# Altium footprint library MPPT.PcbLib: 16 footprints
Each footprint in its own frame and in the unit in brackets; x right, y up, seen from the top. Pads: shape width x height; smd on the part's side, far side on the other; paste and mask are expansions set on the pad; w line width, h text height; cw(c..) or ccw(c..) is an arc to the next point about the centre after c.
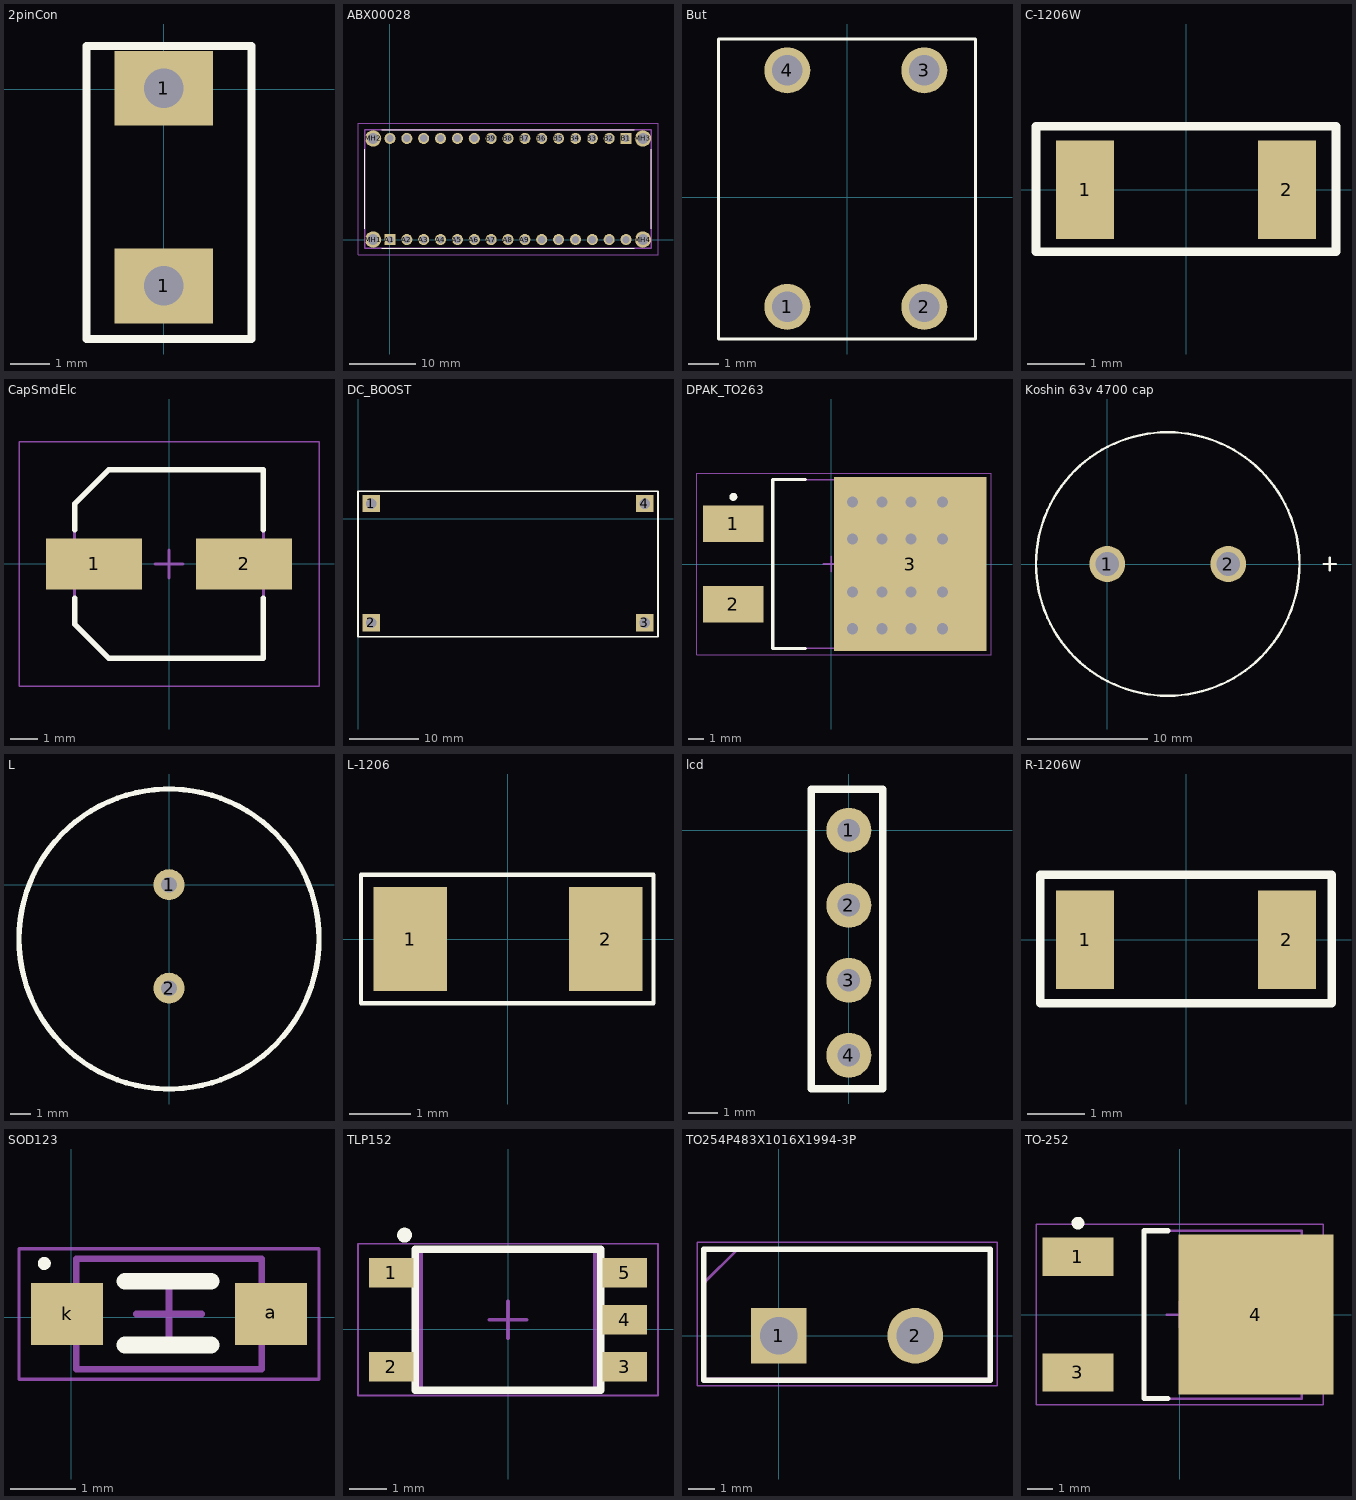
[diagram p0: the footprints below, top view; thin cyan lines are the x and y axes]

## 2pinCon [mm]
pads (2):
  rect 2.5x1.9 hole 1: 1(0,-5) 1(0,0.025)
Top Overlay:
  lines w0.2: -1.965,-6.35 2.225,-6.35 2.225,1.1 -1.965,1.1 -1.965,-6.35
3D body "User Library-bornera-1.step": height 10.01, standoff -3.74, extent -5.07,-8.001 2.53,2.499
3D body: height 1.4, standoff -1.4, extent -5,-0.775 -5,-0.775

## ABX00028 [mm]
pads (34):
  rect 1.665x1.665 hole 1.11: A1(0,0) B1(35.56,15.24)
  round 1.665 hole 1.11: A2(2.54,0) A3(5.08,0) A4(7.62,0) A5(10.16,0) A6(12.7,0) A7(15.24,0) A8(17.78,0) A9(20.32,0) A10(22.86,0) A11(25.4,0) A12(27.94,0) A13(30.48,0) A14(33.02,0) A15(35.56,0) B2(33.02,15.24) B3(30.48,15.24) B4(27.94,15.24) B5(25.4,15.24) B6(22.86,15.24) B7(20.32,15.24) B8(17.78,15.24) B9(15.24,15.24) B10(12.7,15.24) B11(10.16,15.24) B12(7.62,15.24) B13(5.08,15.24) B14(2.54,15.24) B15(0,15.24)
  round 2.475 hole 1.65: MH1(-2.54,0) MH2(-2.54,15.24) MH3(38.1,15.24) MH4(38.1,0)
Top Overlay:
  lines w0.1: -3.81,1.62 -3.81,13.62 ; -1.22,-1.27 36.78,-1.27 ; -1.22,16.51 36.78,16.51 ; 39.37,1.62 39.37,13.62
Mechanical 13:
  lines w0.2: -3.81,-1.27 -3.81,16.51 39.37,16.51 39.37,-1.27 -3.81,-1.27
Mechanical 15:
  lines w0.1: -4.81,-2.27 -4.81,17.51 40.37,17.51 40.37,-2.27 -4.81,-2.27
3D body "User Library-Nano-1.STEP": height 12.73, standoff -5.83, extent -5.588,-1.397 39.332,16.393

## But [mm]
pads (4):
  round 1.5 hole 1: 1(-1.95,-3.575) 2(2.525,-3.575) 3(2.525,4.15) 4(-1.95,4.15)
Top Overlay:
  lines w0.1: -4.2,-4.625 -1.675,-4.625 1.675,-4.625 4.2,-4.625 4.2,5.175 -4.2,5.175 -4.2,-4.625
3D body "Tactal Switch - SMD (6mmx 6mmx 9mm) - Marked.stp": height 9, standoff 0, extent -2.775,-4.334 3.257,4.684

## C-1206W [mm] "capacitor 1206 wave soldering"
pads (2):
  rect 1x1.7 smd: 1(-1.75,0) 2(1.75,0)
Top Overlay:
  lines w0.152: -2.6,-1.075 -2.6,1.1 2.6,1.1 2.6,-1.075 2.45,-1.075 -2.6,-1.075
3D body "CAP1206.stp": height 1, standoff 0, extent -1.6,-0.8 1.6,0.8

## CapSmdElc [mm] "Aluminum Electrolytic Capacitor, Body 6.70x6.70x6.30mm, IPC Low Density"
height 6.3
pads (2):
  rect 3.45x1.85 smd: 1(-2.7,0) 2(2.7,0)
Top Overlay:
  lines w0.2: -3.4,-1.225 -3.4,-2.163 -2.163,-3.4 3.4,-3.4 3.4,-1.225 ; -3.4,1.225 -3.4,2.163 -2.163,3.4 3.4,3.4 3.4,1.225
Top Assembly:
  lines w0.1: -3.4,-2.163 -3.4,2.163 -2.163,3.4 3.4,3.4 3.4,-3.4 -2.163,-3.4 -3.4,-2.163
Top Courtyard:
  lines w0.05: -5.4,-4.4 5.4,-4.4 5.4,4.4 -5.4,4.4 -5.4,-4.4
  lines w0.1: -0.5,0 0.5,0 ; 0,-0.5 0,0.5
3D body "User Library-Nichicon_CW6_3x7.STEP": height 6.92, standoff 0.01, extent -3.45,-3.275 3.55,3.325

## DC_BOOST [mm]
pads (4):
  rect 2.5x2.5 hole 1.5: 1(1.905,2.159) 2(1.905,-14.986) 3(41.275,-14.986) 4(41.275,2.159)
Top Overlay:
  lines w0.254: -0.002,-17.017 -0.002,3.937 43.178,3.937 43.178,-17.017 ; 0,-17.018 43.18,-17.018
3D body "XL6009.stp": height 12.76, standoff -5.2, extent -0.127,-17.018 43.053,4.064

## DPAK_TO263 [mm] "D2-PAK, 3-Pads, Body 7.93x8.70mm (max), IPC Medium Density"
height 4.8
pads (3):
  rect 3.81x2.32 smd: 1(-6.2,2.54) 2(-6.2,-2.54)
  rect 9.65x11 smd: 3(5,0)
via 1.35,3.925 diameter 1.27 hole 0.711
via 3.225,3.925 diameter 1.27 hole 0.711
via 5.05,3.925 diameter 1.27 hole 0.711
via 7.05,3.925 diameter 1.27 hole 0.711
via 1.35,1.575 diameter 1.27 hole 0.711
via 3.225,1.575 diameter 1.27 hole 0.711
via 5.05,1.575 diameter 1.27 hole 0.711
via 7.05,1.575 diameter 1.27 hole 0.711
via 1.35,-1.775 diameter 1.27 hole 0.711
via 3.225,-1.775 diameter 1.27 hole 0.711
via 5.05,-1.775 diameter 1.27 hole 0.711
via 7.05,-1.775 diameter 1.27 hole 0.711
via 1.35,-4.1 diameter 1.27 hole 0.711
via 3.225,-4.1 diameter 1.27 hole 0.711
via 5.05,-4.1 diameter 1.27 hole 0.711
via 7.05,-4.1 diameter 1.27 hole 0.711
Top Overlay:
  circle w0.25: c-6.2,4.25 r0.125
  lines w0.2: -1.625,-5.35 -3.7,-5.35 -3.7,5.35 -1.625,5.35
Top Assembly:
  lines w0.1: -3.7,-5.325 5.95,-5.325 5.95,5.325 -3.7,5.325 -3.7,-5.325
Top Courtyard:
  lines w0.05: -8.5,-5.75 10.125,-5.75 10.125,5.75 -8.5,5.75 -8.5,-5.75
  lines w0.1: -0.5,0 0.5,0 ; 0,-0.5 0,0.5
3D body "User Library-TO263-3S.STEP": height 4.81, standoff 0.01, extent -7.515,-4.975 8.155,5.025

## Koshin 63v 4700 cap [mm]
pads (2):
  round 3 hole 2: 1(0,0) 2(10.1,0)
Top Overlay:
  circle w0.2: c5.05,0 r11
  lines w0.2: 18.082,0 19.098,0 ; 18.59,-0.508 18.59,0.508
3D body "U1-YY.step": height 49.77, standoff -5.58, extent -6.045,-11.176 15.951,10.82

## L [mil]
pads (2):
  round 60 hole 30: 1(0,0) 2(0,-200)
Top Overlay:
  circle w10: c0,-105 r289.91
3D body "User Library-Inductor 10x12 (LS5).STEP": height 472.94, standoff -156.98, extent -198.7,-296.85 195,96.85

## L-1206 [mm]
pads (2):
  rect 1.2x1.7 smd: 1(-1.6,0) 2(1.6,0)
Top Overlay:
  lines w0.07: -2.4,-1.05 -2.4,1.05 2.375,1.05 2.375,0.692 2.375,0.556 2.375,-0.531 2.375,-1.05 -2.4,-1.05
3D body "SML-LXLC1206.stp": height 1.11, standoff 0, extent -1.73,-0.8 1.476,0.8

## lcd [mil]
pads (4):
  round 60 hole 30: 1(0,0) 2(0,-100) 3(0,-200) 4(0,-300)
Top Overlay:
  lines w10: -50,-345 -50,55 45,55 45,-345 -50,-345
3D body "User Library-AC162B.step": height 433.57, standoff -113.67, extent -109.8,-828.66 3039.8,588.66

## R-1206W [mm] "resistor 1206 wave soldering"
pads (2):
  rect 1x1.7 smd: 1(-1.75,0) 2(1.75,0)
Top Overlay:
  lines w0.152: -2.525,-1.1 -2.525,1.125 1.605,1.125 2.525,1.125 2.525,-1.1 -2.525,-1.1
3D body "RES1206.stp": height 0.55, standoff 0, extent -1.55,-0.775 1.55,0.777

## SOD123 [mm]
height 1.35
pads (2):
  rect 1.1x0.95 smd: a(3.063,0.05) k(-0.062,0.05)
Top Overlay:
  circle w0.1: c-0.412,0.825 r0.05
  lines w0.254: 0.825,-0.425 2.15,-0.425 ; 0.825,0.55 2.15,0.55
Top Assembly:
  lines w0.1: 0.075,-0.8 0.075,0.9 2.925,0.9 2.925,-0.8 0.075,-0.8
Top Courtyard:
  lines w0.05: -0.8,-0.95 -0.8,1.05 3.8,1.05 3.8,-0.95 -0.8,-0.95
  lines w0.1: 1,0.05 2,0.05 ; 1.5,-0.45 1.5,0.55
3D body "CircuitWorks-SOD123.STEP": height 1.28, standoff 0.01, extent -0.375,-0.775 3.325,0.825

## TLP152 [mm] "SOTFL, 5-Leads, Body 3.75x7.20mm, Pitch 1.27mm, IPC Medium Density"
height 2.2
pads (5):
  rect 1.2x0.8 smd: 1(-3.15,1.524) 2(-3.15,-1.016) 3(3.15,-1.016) 4(3.15,0.254) 5(3.15,1.524)
Top Overlay:
  lines w0.2: -2.5,-1.646 -2.5,2.154 2.5,2.154 2.5,-1.646 -2.5,-1.646
  lines w0.25: -2.72,2.538 cw(c-2.794,2.54) -2.72,2.547
Top Assembly:
  lines w0.1: -2.35,-1.646 2.35,-1.646 2.35,2.154 -2.35,2.154 -2.35,-1.646
Top Courtyard:
  lines w0.05: -4.05,-1.796 4.05,-1.796 4.05,2.304 -4.05,2.304 -4.05,-1.796
  lines w0.1: -0.5,0.254 0.5,0.254 ; 0,-0.246 0,0.754
3D body "User Library-TLP-152-1.STEP": height 2.11, standoff 0.01, extent -3.393,-1.651 3.383,2.149

## TO254P483X1016X1994-3P [mm]
pads (2):
  rect 2.07x2.07 hole 1.38: 1(0,0)
  round 2.07 hole 1.38: 2(5.08,0)
Top Overlay:
  lines w0.2: -2.795,-1.65 -2.795,3.225 7.874,3.225 7.874,-1.65 -2.795,-1.65
Mechanical 13:
  lines w0.1: -2.795,1.955 -1.525,3.225 ; -2.795,-1.605 -2.795,3.225 7.875,3.225 7.875,-1.605 -2.795,-1.605
Mechanical 15:
  lines w0.05: -3.045,-1.855 -3.045,3.475 8.125,3.475 8.125,-1.855 -3.045,-1.855
3D body "User Library-IRF1607 Transistors MOSFET N-Channel TO-220AB.step": height 19.19, standoff -13.73, extent -2.593,-1.665 7.673,2.54

## TO-252 [mm]
height 2.4
pads (3):
  rect 2.8x1.5 smd: 1(-4,2.275) 3(-4,-2.275)
  rect 6.1x6.3 smd: 4(3,0)
Top Overlay:
  circle w0.25: c-4,3.6 r0.125
  lines w0.2: -0.45,-3.3 -1.4,-3.3 -1.4,3.3 -0.45,3.3
Top Assembly:
  lines w0.1: -1.4,-3.3 -1.4,3.3 4.8,3.3 4.8,-3.3 -1.4,-3.3
Top Courtyard:
  lines w0.05: -5.65,-3.55 -5.65,3.55 5.65,3.55 5.65,-3.55 -5.65,-3.55
  lines w0.1: -0.5,0 0.5,0 ; 0,-0.5 0,0.5
3D body "User Library-DPAK_TO-252AA.step": height 2.41, standoff 0.01, extent -4.523,-3.367 5.577,3.367